# Altium footprint library RGBandGestureSensors.PcbLib: 43 footprints (part 3 of 3)
Each footprint in its own frame and in the unit in brackets; x right, y up, seen from the top. Pads: shape width x height; smd on the part's side, far side on the other; paste and mask are expansions set on the pad; w line width, h text height; cw(c..) or ccw(c..) is an arc to the next point about the centre after c.
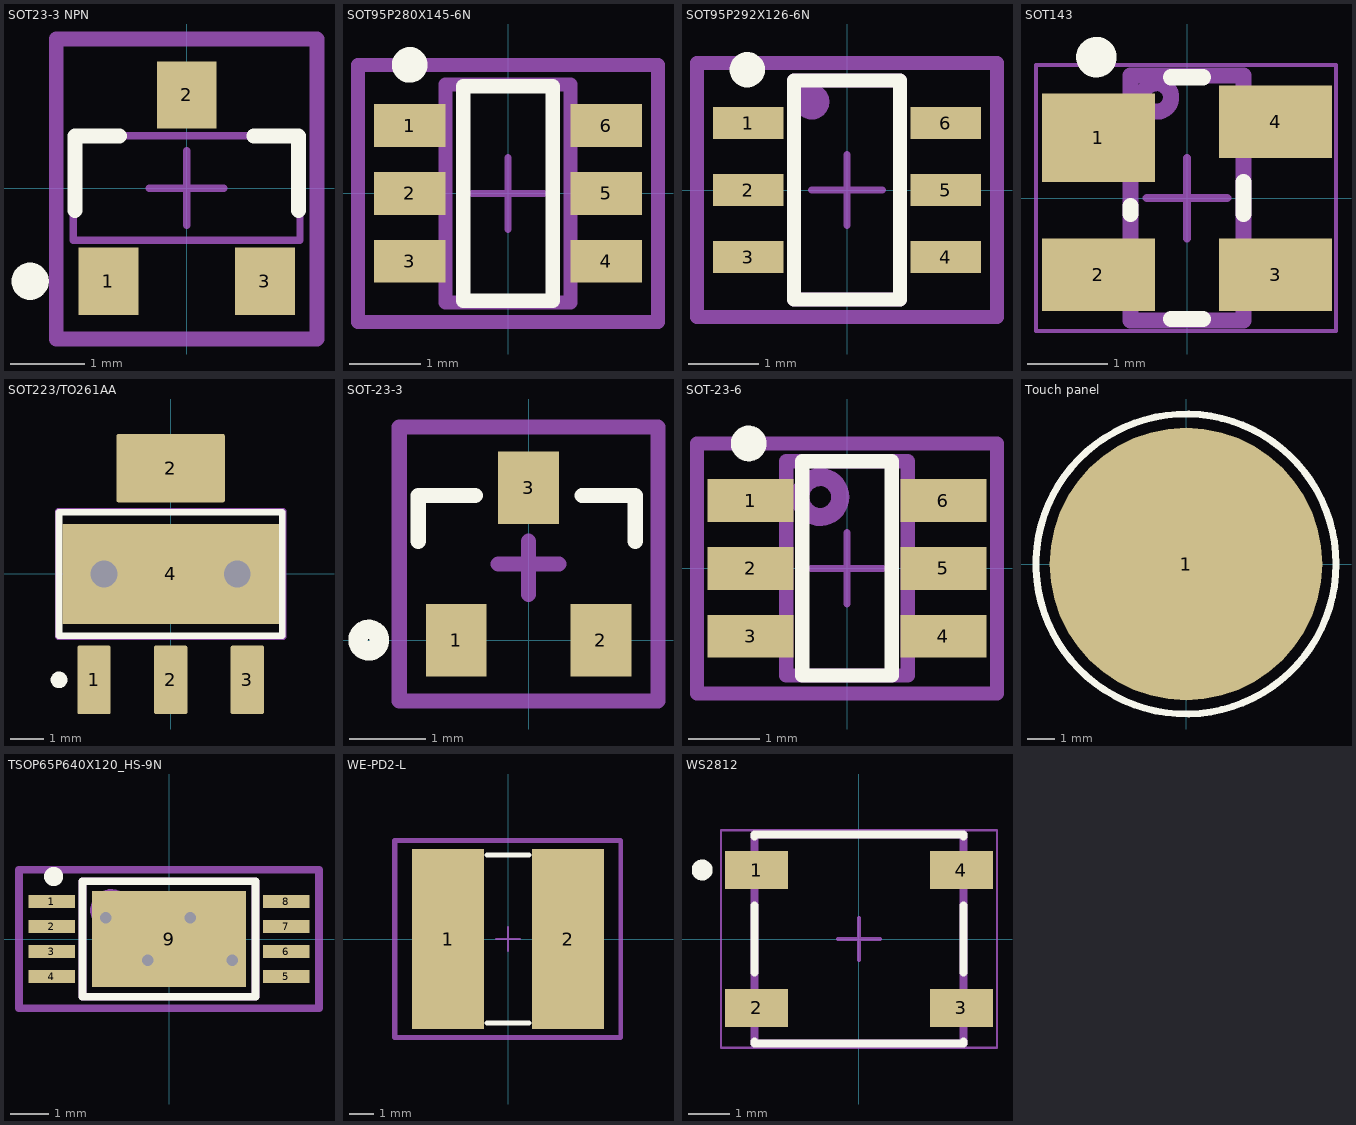
[diagram p2: the footprints below, top view; thin cyan lines are the x and y axes]

## SOT23-3 NPN [mm]
height 1.12
pads (3):
  rect 0.8x0.9 smd: 1(-1.05,-1.25) 2(0,1.25) 3(1.05,-1.25)
Top Overlay:
  circle w0.25: c-2.1,-1.25 r0.125
  lines w0.2: -1.5,-0.3 -1.5,0.7 -0.9,0.7 ; 0.9,0.7 1.5,0.7 1.5,-0.3
Top Assembly:
  lines w0.1: -0.5,0 0.5,0 ; 0,-0.5 0,0.5 ; -1.52,-0.7 -1.52,0.7 1.52,0.7 1.52,-0.7 -1.52,-0.7
Mechanical 15:
  lines w0.2: -1.75,-2.025 1.75,-2.025 1.75,2 -1.75,2 -1.75,-2.025
3D body "mmbt3904.stp": height 1.08, standoff 0, extent -1.5,-1.17 1.42,1.17

## SOT95P280X145-6N [mm] "SOT23, 6-Leads, Body 2,90x2,80mm, Pitch 0,95mm, IPC Medium Density"
height 1.45
pads (6):
  rect 1x0.6 smd: 1(-1.375,0.95) 2(-1.375,0) 3(-1.375,-0.95) 4(1.375,-0.95) 5(1.375,0) 6(1.375,0.95)
Top Overlay:
  circle w0.25: c-1.375,1.8 r0.125
  lines w0.2: -0.625,-1.5 0.625,-1.5 0.625,1.5 -0.625,1.5 -0.625,-1.5
Top Assembly:
  lines w0.2: -0.875,-1.525 -0.875,1.525 0.875,1.525 0.875,-1.525 -0.875,-1.525
Mechanical 15:
  lines w0.1: -0.5,0 0.5,0 ; 0,-0.5 0,0.5
  lines w0.2: -2.1,-1.8 -2.1,1.8 2.1,1.8 2.1,-1.8 -2.1,-1.8
3D body "SOT95P280X145-6N.step": height 1.45, standoff 0, extent -1.499,-1.525 1.499,1.525

## SOT95P292X126-6N [mm] "SOT23, 6-Leads, Body 3,00x2,93mm, Pitch 0,95mm, IPC Medium Density"
height 1.26
pads (6):
  rect 1x0.45 smd: 1(-1.4,0.95) 2(-1.4,0) 3(-1.4,-0.95) 4(1.4,-0.95) 5(1.4,0) 6(1.4,0.95)
Top Overlay:
  circle w0.25: c-1.413,1.705 r0.125
  lines w0.2: -0.75,-1.55 0.75,-1.55 0.75,1.55 -0.75,1.55 -0.75,-1.55
Top Assembly:
  circle w0.25: c-0.5,1.25 r0.125
  lines w0.2: -0.75,-1.55 -0.75,1.55 0.75,1.55 0.75,-1.55 -0.75,-1.55
Mechanical 15:
  lines w0.1: -0.5,0 0.5,0 ; 0,-0.5 0,0.5
  lines w0.2: -2.125,-1.8 -2.125,1.8 2.125,1.8 2.125,-1.8 -2.125,-1.8
3D body "SOT95P292X126-6N.step": height 1.26, standoff 0, extent -1.5,-1.55 1.5,1.55

## SOT143 [mm]
pads (4):
  rect 1.4x1.1 smd: 1(-1.1,0.75)
  rect 1.4x0.9 smd: 2(-1.1,-0.95) 3(1.1,-0.95) 4(1.1,0.95)
Top Overlay:
  circle w0.254: c-1.125,1.75 r0.125
  lines w0.2: -0.7,-0.2 -0.7,-0.1 ; -0.2,-1.5 0.2,-1.5 ; -0.2,1.5 0.2,1.5 ; 0.7,-0.2 0.7,0.2
Top Assembly:
  circle w0.2: c-0.375,1.25 r0.177
  lines w0.2: -0.7,-1.52 0.7,-1.52 0.7,1.52 -0.7,1.52 -0.7,-1.52
Mechanical 15:
  lines w0.05: -1.875,-1.65 -1.875,1.65 1.85,1.65 1.85,-1.65 -1.875,-1.65
  lines w0.1: -0.5,0 0.5,0 ; 0,-0.5 0,0.5
3D body "User Library-sot143-2.STEP": height 1, standoff 0, extent -1.21,-1.46 1.21,1.46

## SOT223/TO261AA [mm]
pads (5):
  rrect10% 1x2.05 smd: 1(-2.3,-3.175) 2(0,-3.175) 3(2.3,-3.175)
  rrect5% 3.25x2.05 smd: 2(0,3.175)
  rect 6.5x3 smd: 4(0,0)
via -2,0 diameter 1.2 hole 0.8
via 2,0 diameter 1.2 hole 0.8
Top Overlay:
  circle w0.25: c-3.35,-3.175 r0.125
  lines w0.2: -3.35,-1.85 -3.35,1.85 3.35,1.85 3.35,-1.85 -3.35,-1.85
Top Assembly:
  lines w0.2: -3.375,-1.875 -3.375,1.875 3.375,1.875 3.375,-1.875 -3.375,-1.875
3D body "CircuitWorks-SOT-223.STEP": height 1.6, standoff -0.08, extent -3.25,-3.48 3.25,3.48

## SOT-23-3 [mm]
pads (3):
  rect 0.8x0.95 smd: 1(-0.95,0) 2(0.95,0) 3(0,2)
Top Overlay:
  circle w0.254: c-2.1,0 r0.141
  lines w0.2: -1.45,1.3 -1.45,1.9 ; -1.4,1.9 -0.7,1.9 ; 0.7,1.9 1.4,1.9 1.4,1.3
Top Assembly:
  lines w0.2: -1.7,-0.8 1.7,-0.8 1.7,2.8 -1.7,2.8 -1.7,-0.8
Mechanical 15:
  lines w0.2: -0.4,1 0.4,1 ; 0,0.6 0,1.3 ; -1.7,-0.8 1.7,-0.8 1.7,2.8 -1.7,2.8 -1.7,-0.8
3D body "CircuitWorks-SOT-23.STEP": height 1.05, standoff -0.05, extent -1.5,-0.25 1.5,2.25

## SOT-23-6 [mm] "SOT23, 6-Leads, Body 2,90x2,80mm, Pitch 0,95mm, IPC Medium Density"
height 1.45
pads (6):
  rect 1.2x0.6 smd: 1(-1.35,0.95) 2(-1.35,0) 3(-1.35,-0.95) 4(1.35,-0.95) 5(1.35,0) 6(1.35,0.95)
Top Overlay:
  circle w0.25: c-1.375,1.75 r0.125
  lines w0.2: -0.625,-1.5 -0.625,1.5 0.625,1.5 0.625,-1.5 -0.625,-1.5
Top Assembly:
  circle w0.254: c-0.375,1 r0.28
  lines w0.2: -0.85,-1.5 0.85,-1.5 0.85,1.5 -0.85,1.5 -0.85,-1.5
Mechanical 15:
  lines w0.1: -0.5,0 0.5,0 ; 0,-0.5 0,0.5
  lines w0.2: -2.1,-1.75 2.1,-1.75 2.1,1.75 -2.1,1.75 -2.1,-1.75
3D body "User Library-SOT23-6-4.STEP": height 1, standoff -0.1, extent -1.24,-1.442 1.16,1.458

## Touch panel [mm]
pads (1):
  round 10 smd paste+0: 1(0,0)
Top Overlay:
  circle w0.254: c0,0 r5.5
  circle w0.254: c0,0 r4.5
  circle w0.254: c0,0 r3.5
  text "Touch" at -2.625,-0.75 h1

## TSOP65P640X120_HS-9N [mm] "TSOP, 8-Leads, Body 2,93x4,40mm, Pitch 0,65mm, Thermal Pad 2,50x4,00mm, IPC Medium Density"
height 1.2
pads (9):
  rect 1.2x0.35 smd: 1(-3.05,0.975) 2(-3.05,0.325) 3(-3.05,-0.325) 4(-3.05,-0.975) 5(3.05,-0.975) 6(3.05,-0.325) 7(3.05,0.325) 8(3.05,0.975)
  rect 4x2.5 smd: 9(0,0)
via 1.65,-0.55 diameter 0.6 hole 0.3
via -0.55,-0.55 diameter 0.6 hole 0.3
via 0.55,0.55 diameter 0.6 hole 0.3
via -1.65,0.55 diameter 0.6 hole 0.3
Top Overlay:
  circle w0.25: c-3,1.625 r0.125
  lines w0.2: -2.25,-1.5 -2.25,1.5 2.25,1.5 2.25,-1.5 -2.25,-1.5
Top Assembly:
  circle w0.1: c-1.5,0.75 r0.5
  lines w0.2: -2.25,-1.5 2.25,-1.5 2.25,1.5 -2.25,1.5 -2.25,-1.5
Mechanical 15:
  lines w0.1: -0.5,0 0.5,0 ; 0,-0.5 0,0.5
  lines w0.2: -3.9,-1.8 3.9,-1.8 3.9,1.8 -3.9,1.8 -3.9,-1.8
3D body "TSOP65P640X120_HS-9N.step": height 1.2, standoff 0, extent -3.2,-1.5 3.2,1.5

## WE-PD2-L [mm]
pads (2):
  rect 3x7.5 smd: 1(-2.5,0) 2(2.5,0)
Top Overlay:
  lines w0.2: -0.875,-3.5 0.875,-3.5 ; -0.875,3.5 0.875,3.5
Top Assembly:
  lines w0.2: -4.725,-4.1 4.7,-4.1 4.7,4.1 -4.725,4.1 -4.725,-4.1
Mechanical 13:
  lines w0.2: -4.7,-4.1 4.7,-4.1 4.7,4.1 -4.7,4.1 -4.7,-4.1
Mechanical 15:
  lines w0.1: -0.5,0 0.5,0 ; 0,-0.5 0,0.5
  lines w0.2: -4.7,-4.1 -4.7,4.1 4.7,4.1 4.7,-4.1 -4.7,-4.1
3D body "74477510.stp": height 4.89, standoff -0.01, extent -3.813,-3.5 3.813,3.5

## WS2812 [mm]
pads (4):
  rect 1.5x0.9 smd: 1(-2.448,1.65) 2(-2.448,-1.65) 3(2.452,-1.65) 4(2.452,1.65)
Top Overlay:
  circle w0.25: c-3.748,1.65 r0.125
  lines w0.2: -2.498,-2.45 -2.498,-2.5 2.502,-2.5 2.502,-2.45 ; -2.498,-0.8 -2.498,0.8 ; -2.498,2.45 -2.498,2.5 2.502,2.5 2.502,2.45 ; 2.502,-0.8 2.502,0.8
Top Assembly:
  lines w0.2: -2.498,-2.5 -2.498,2.5 2.502,2.5 2.502,-2.5 -2.498,-2.5
Mechanical 15:
  lines w0.05: -3.298,-2.6 3.302,-2.6 3.302,2.6 -3.298,2.6 -3.298,-2.6
  lines w0.1: -0.498,0 0.502,0 ; 0.002,-0.5 0.002,0.5
3D body "User Library-WS2812B.STEP": height 1.68, standoff -0.02, extent -2.698,-2.5 2.702,2.5